# Altium footprint library mcu_modules.PcbLib: 16 footprints (part 2 of 2)
Each footprint in its own frame and in the unit in brackets; x right, y up, seen from the top. Pads: shape width x height; smd on the part's side, far side on the other; paste and mask are expansions set on the pad; w line width, h text height; cw(c..) or ccw(c..) is an arc to the next point about the centre after c.
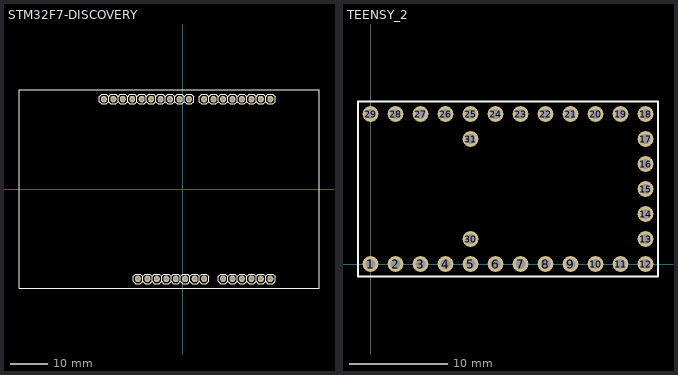
[diagram p1: the footprints below, top view; thin cyan lines are the x and y axes]

## STM32F7-DISCOVERY [mm]
pads (32):
  oval 1.6x1.8 hole 1: A0(10.795,-24.13) A1(13.335,-24.13) A2(15.875,-24.13) A3(18.415,-24.13) A4(20.955,-24.13) A5(23.495,-24.13) AREF(-16.129,24.13) D0(23.495,24.13) D1(20.955,24.13) D2(18.415,24.13) D3(15.875,24.13) D4(13.335,24.13) D5(10.795,24.13) D6(8.255,24.13) D7(5.715,24.13) D8(1.651,24.13) D9(-0.889,24.13) D10(-3.429,24.13) D11(-5.969,24.13) D12(-8.509,24.13) D13(-11.049,24.13) GND(-13.589,24.13) P1(-12.065,-24.13) P2(-9.525,-24.13) P3(-6.985,-24.13) P4(-4.445,-24.13) P5(-1.905,-24.13) P6(0.635,-24.13) P7(3.175,-24.13) P8(5.715,-24.13) SCL(-21.209,24.13) SDA(-18.669,24.13)
Top Overlay:
  drawing of 240 lines, arcs and shapes, not listed
Mechanical 16:
  rectangle: 2.921,-24.384 3.429,-23.876
  rectangle: 0.381,-24.384 0.889,-23.876
  rectangle: -2.159,-24.384 -1.651,-23.876
  rectangle: -4.699,-24.384 -4.191,-23.876
  rectangle: -7.239,-24.384 -6.731,-23.876
  rectangle: -9.779,-24.384 -9.271,-23.876
  rectangle: -12.319,-24.384 -11.811,-23.876
  rectangle: 5.461,-24.384 5.969,-23.876
  rectangle: 20.701,-24.384 21.209,-23.876
  rectangle: 18.161,-24.384 18.669,-23.876
  rectangle: 15.621,-24.384 16.129,-23.876
  rectangle: 13.081,-24.384 13.589,-23.876
  rectangle: 10.541,-24.384 11.049,-23.876
  rectangle: 23.241,-24.384 23.749,-23.876
  region: -18.415,24.384 -18.923,24.384 -18.923,23.876 -18.415,23.876
  region: -15.875,24.384 -16.383,24.384 -16.383,23.876 -15.875,23.876
  region: -13.335,24.384 -13.843,24.384 -13.843,23.876 -13.335,23.876
  region: -10.795,24.384 -11.303,24.384 -11.303,23.876 -10.795,23.876
  region: -8.255,24.384 -8.763,24.384 -8.763,23.876 -8.255,23.876
  region: -5.715,24.384 -6.223,24.384 -6.223,23.876 -5.715,23.876
  region: -3.175,24.384 -3.683,24.384 -3.683,23.876 -3.175,23.876
  region: -0.635,24.384 -1.143,24.384 -1.143,23.876 -0.635,23.876
  region: 1.905,24.384 1.397,24.384 1.397,23.876 1.905,23.876
  region: -20.955,24.384 -21.463,24.384 -21.463,23.876 -20.955,23.876
  region: 8.509,24.384 8.001,24.384 8.001,23.876 8.509,23.876
  region: 11.049,24.384 10.541,24.384 10.541,23.876 11.049,23.876
  region: 13.589,24.384 13.081,24.384 13.081,23.876 13.589,23.876
  region: 16.129,24.384 15.621,24.384 15.621,23.876 16.129,23.876
  region: 18.669,24.384 18.161,24.384 18.161,23.876 18.669,23.876
  region: 21.209,24.384 20.701,24.384 20.701,23.876 21.209,23.876
  region: 23.749,24.384 23.241,24.384 23.241,23.876 23.749,23.876
  region: 5.969,24.384 5.461,24.384 5.461,23.876 5.969,23.876
Mechanical 69:
  text "D:/SmartProjects/Snc/a4_bn_logo2.bmp" at -40.005,-26.733 h0.02
3D body "Samtec-TSW-110-23-F-S.STEP": height 8.38, standoff -2.92, extent -22.479,22.86 2.921,25.4
3D body "Samtec-TSW-106-23-F-S.STEP": height 8.38, standoff -2.92, extent 9.525,-25.4 24.765,-22.86
3D body "Samtec-TSW-108-23-F-S.STEP": height 8.38, standoff -2.92, extent -13.335,-25.4 6.985,-22.86
3D body "Samtec-TSW-108-23-F-S.STEP": height 8.38, standoff -2.92, extent 4.445,22.86 24.765,25.4

## TEENSY_2 [mm]
pads (31):
  round 1.6 hole 1: 1(0,0) 2(2.54,0) 3(5.08,0) 4(7.62,0) 5(10.16,0) 6(12.7,0) 7(15.24,0) 8(17.78,0) 9(20.32,0) 10(22.86,0) 11(25.4,0) 12(27.94,0) 13(27.94,2.54) 14(27.94,5.08) 15(27.94,7.62) 16(27.94,10.16) 17(27.94,12.7) 18(27.94,15.24) 19(25.4,15.24) 20(22.86,15.24) 21(20.32,15.24) 22(17.78,15.24) 23(15.24,15.24) 24(12.7,15.24) 25(10.16,15.24) 26(7.62,15.24) 27(5.08,15.24) 28(2.54,15.24) 29(0,15.24) 30(10.16,2.54) 31(10.16,12.7)
Top Overlay:
  lines w0.2: -1.27,-1.27 -1.27,16.51 29.21,16.51 29.21,-1.27 -1.27,-1.27
3D body "User Library-Switch-CK-KMR2.STEP": height 3.6, standoff 1.5, extent 23.3,5.9 26.3,10.5
3D body "User Library-smd_qfn-44-2.step": height 2.4, standoff 1.5, extent 12.899,3.899 19.901,10.901
3D body "usb_a-usb_b-m5-smd-c.stp": height 5.43, standoff 0.5, extent -1.905,2.67 7.345,12.57
3D body: height 1.5, standoff 0, extent -1.27,-1.27 29.21,16.51